# Altium footprint library THU VIEN V1.PcbLib: 400 footprints (part 24 of 25)
Each footprint in its own frame and in the unit in brackets; x right, y up, seen from the top. Pads: shape width x height; smd on the part's side, far side on the other; paste and mask are expansions set on the pad; w line width, h text height; cw(c..) or ccw(c..) is an arc to the next point about the centre after c.
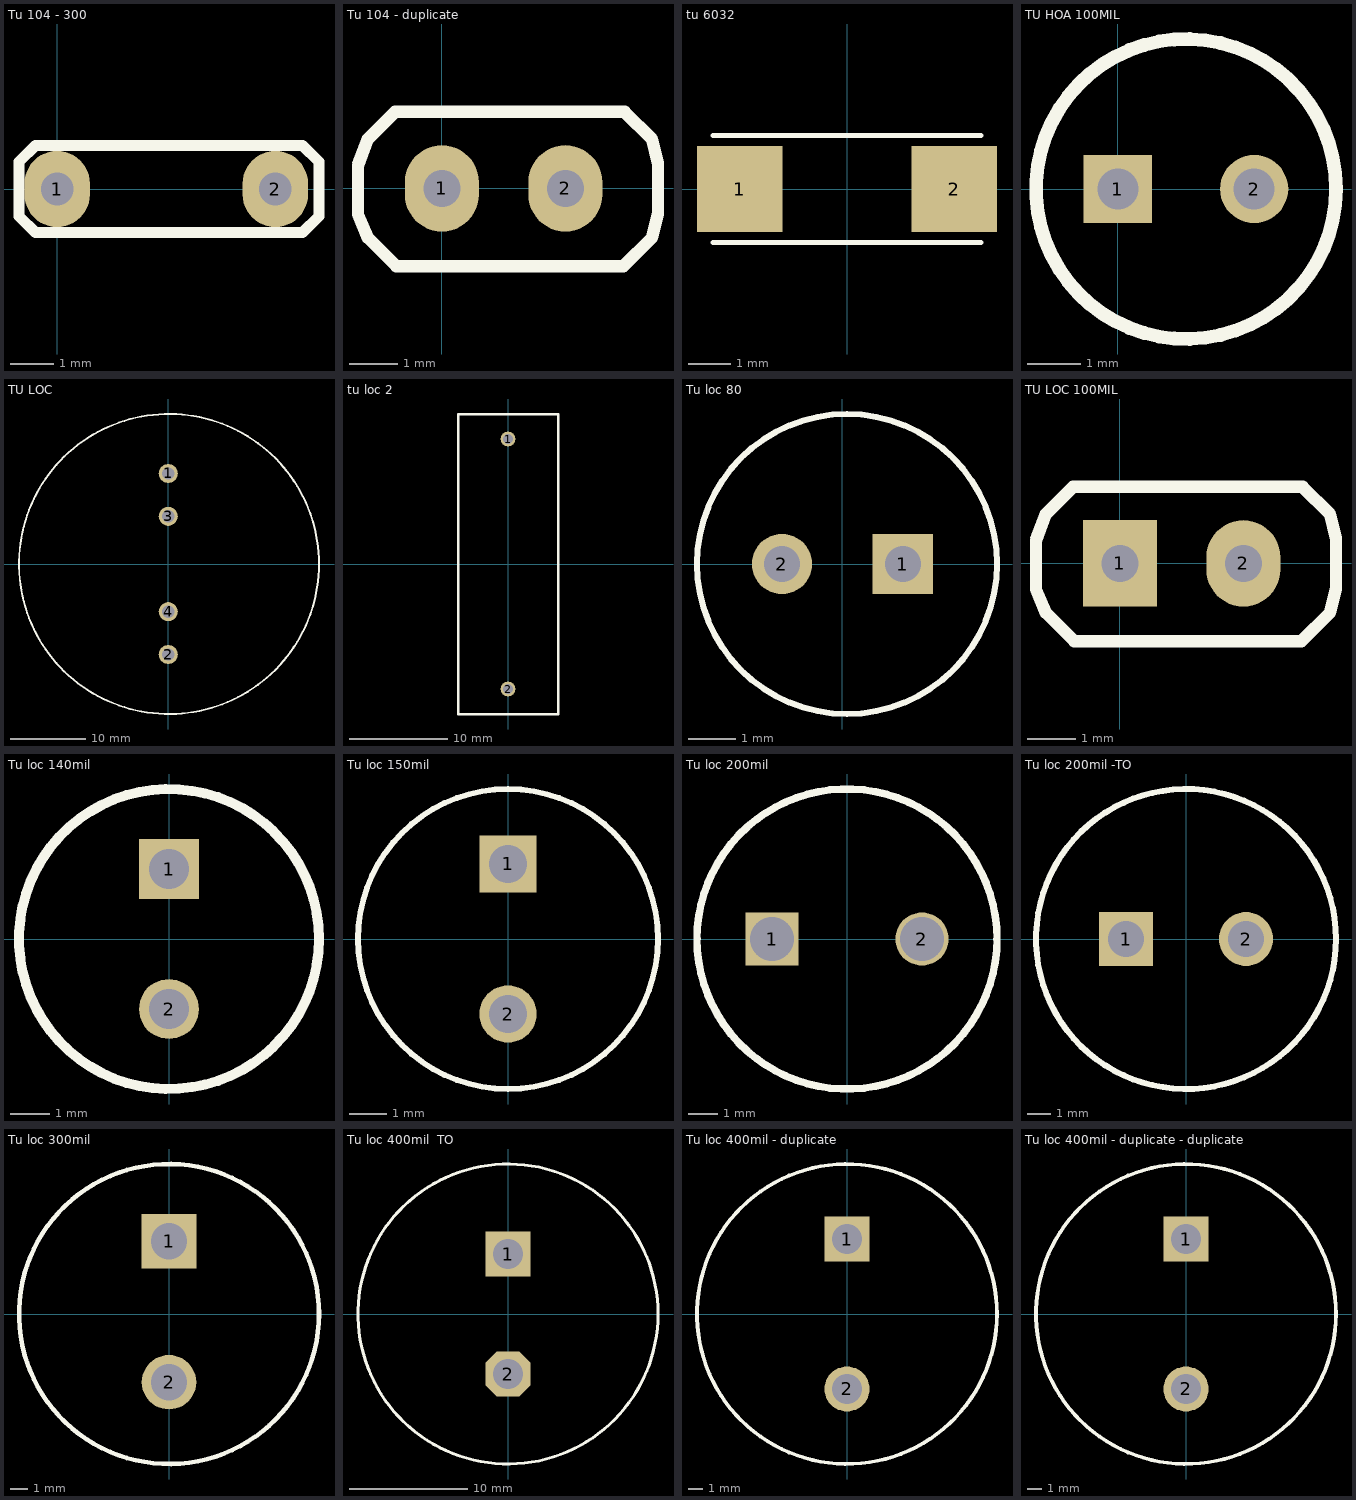
[diagram p23: the footprints below, top view; thin cyan lines are the x and y axes]

## Tu 104 - 300 [mil]
pads (2):
  oval 60x70 hole 30: 1(0,0) 2(200,0)
Top Overlay:
  lines w10: -35,-25 -35,25 -20,40 120,40 225,40 240,25 240,-25 225,-40 -20,-40 -35,-25
3D body: height 200, standoff 30, extent -35,-40 240,40
3D body: height 50, standoff -50, extent -9.91,-9.97 10.01,9.99
3D body: height 50, standoff -50, extent 190.09,-9.97 210.01,9.99

## Tu 104 - duplicate [mil]
pads (2):
  oval 60x70 hole 30: 1(0,0) 2(100,0)
Top Overlay:
  lines w10: -68,-21 -60,-40 -37,-63 147,-63 170,-40 175,-20 175,20 170,40 148,62 -38,62 -60,40 -68,19 -68,-21
3D body: height 530, standoff -414.8, extent -66.79,-62.5 166.87,62.5

## tu 6032 [mil]
pads (2):
  rect 80x80 smd: 1(-100,0) 2(100,0)
Top Overlay:
  lines w5: -125,-50 125,-50 ; -125,50 125,50

## TU HOA 100MIL [mil]
pads (2):
  rect 50x50 hole 30: 1(0,0)
  round 50 hole 30: 2(100,0)
Top Overlay:
  circle w10: c50,0 r110
3D body: height 50, standoff -50, extent 90.09,-9.97 110.01,9.99
3D body: height 50, standoff -50, extent -9.91,-9.97 10.01,9.99
3D body: height 310, standoff 10, extent -59.13,-109.78 160.01,109.79

## TU LOC [mil]
pads (4):
  round 100 hole 65: 1(0,475) 2(0,-475) 3(0,250) 4(0,-250)
Top Overlay:
  circle w10: c3.82,0 r787

## tu loc 2 [mm]
pads (2):
  round 1.5 hole 1: 1(0,12.7) 2(0,-12.7)
Top Overlay:
  lines w0.254: -5.08,-15.24 5.08,-15.24 5.08,15.24 -5.08,15.24 -5.08,-15.24

## Tu loc 80 [mil]
pads (2):
  rect 50x50 hole 30: 1(50,0)
  round 50 hole 30: 2(-50,0)
Top Overlay:
  circle w5: c3.74,0 r124.02
3D body: height 78.74, standoff -452.76, extent -124.6,-124.6 124.61,124.61

## TU LOC 100MIL [mil]
pads (2):
  rect 60x70 hole 30: 1(0,0)
  oval 60x70 hole 30: 2(100,0)
Top Overlay:
  lines w10: -68,-21 -60,-40 -37,-63 147,-63 170,-40 175,-20 175,20 170,40 148,62 -38,62 -60,40 -68,19 -68,-21
3D body: height 200, standoff 30, extent -40,-40 140,40
3D body: height 50, standoff -50, extent 90.09,-9.97 110.01,9.99
3D body: height 50, standoff -50, extent -9.91,-9.97 10.01,9.99

## Tu loc 140mil [mil]
pads (2):
  rect 60x60 hole 40: 1(0,70)
  round 60 hole 40: 2(0,-70)
Top Overlay:
  circle w10: c0,0 r150
3D body: height 477.44, standoff -93.43, extent -157.48,-157.48 157.48,157.49

## Tu loc 150mil [mil]
pads (2):
  rect 60x60 hole 40: 1(0,78.74)
  round 60 hole 40: 2(0,-78.74)
Top Overlay:
  circle w6: c0,0 r157.48
3D body: height 590.55, standoff -669.29, extent -157.48,-157.48 157.48,157.49

## Tu loc 200mil [mm]
pads (2):
  rect 1.8x1.8 hole 1.5: 1(-2.54,0)
  round 1.8 hole 1.5: 2(2.54,0)
Top Overlay:
  circle w0.254: c0,0 r5.08
3D body: height 25.91, standoff -16.95, extent -5.018,-5 5,5.008
3D body: height 25.91, standoff -16.95, extent -5.018,-5 5,5.008

## Tu loc 200mil -TO [mil]
pads (2):
  rect 90x90 hole 60: 1(-100,0)
  round 90 hole 60: 2(100,0)
Top Overlay:
  circle w10: c0,0 r250
3D body: height 811.34, standoff -98.11, extent -246.06,-246.06 246.07,246.07

## Tu loc 300mil [mil]
pads (2):
  rect 120x120 hole 80: 1(0,160)
  round 120 hole 80: 2(0,-150)
Top Overlay:
  circle w10: c0,0 r330
3D body: height 1012.13, standoff -113.86, extent -314.96,-314.96 314.96,314.96

## Tu loc 400mil  TO [mm]
pads (2):
  rect 3.81x3.81 hole 2.54: 1(0,5.08)
  oct 3.81x3.81 hole 2.54: 2(0,-5.08)
Top Overlay:
  circle w0.254: c0,0 r12.7
3D body: height 50.71, standoff -2.89, extent -12.5,-12.5 12.5,12.5

## Tu loc 400mil - duplicate [mil]
pads (2):
  rect 120x120 hole 80: 1(0,200)
  round 120 hole 80: 2(0,-200)
Top Overlay:
  circle w10: c0,0 r400
3D body: height 1405.83, standoff -98.11, extent -393.69,-393.71 393.71,393.69

## Tu loc 400mil - duplicate - duplicate [mil]
pads (2):
  rect 120x120 hole 80: 1(0,200)
  round 120 hole 80: 2(0,-200)
Top Overlay:
  circle w10: c0,0 r400
3D body: height 1405.83, standoff -98.11, extent -393.69,-393.71 393.71,393.69